# Altium footprint library Angler.PcbLib: 331 footprints (part 9 of 21)
Each footprint in its own frame and in the unit in brackets; x right, y up, seen from the top. Pads: shape width x height; smd on the part's side, far side on the other; paste and mask are expansions set on the pad; w line width, h text height; cw(c..) or ccw(c..) is an arc to the next point about the centre after c.
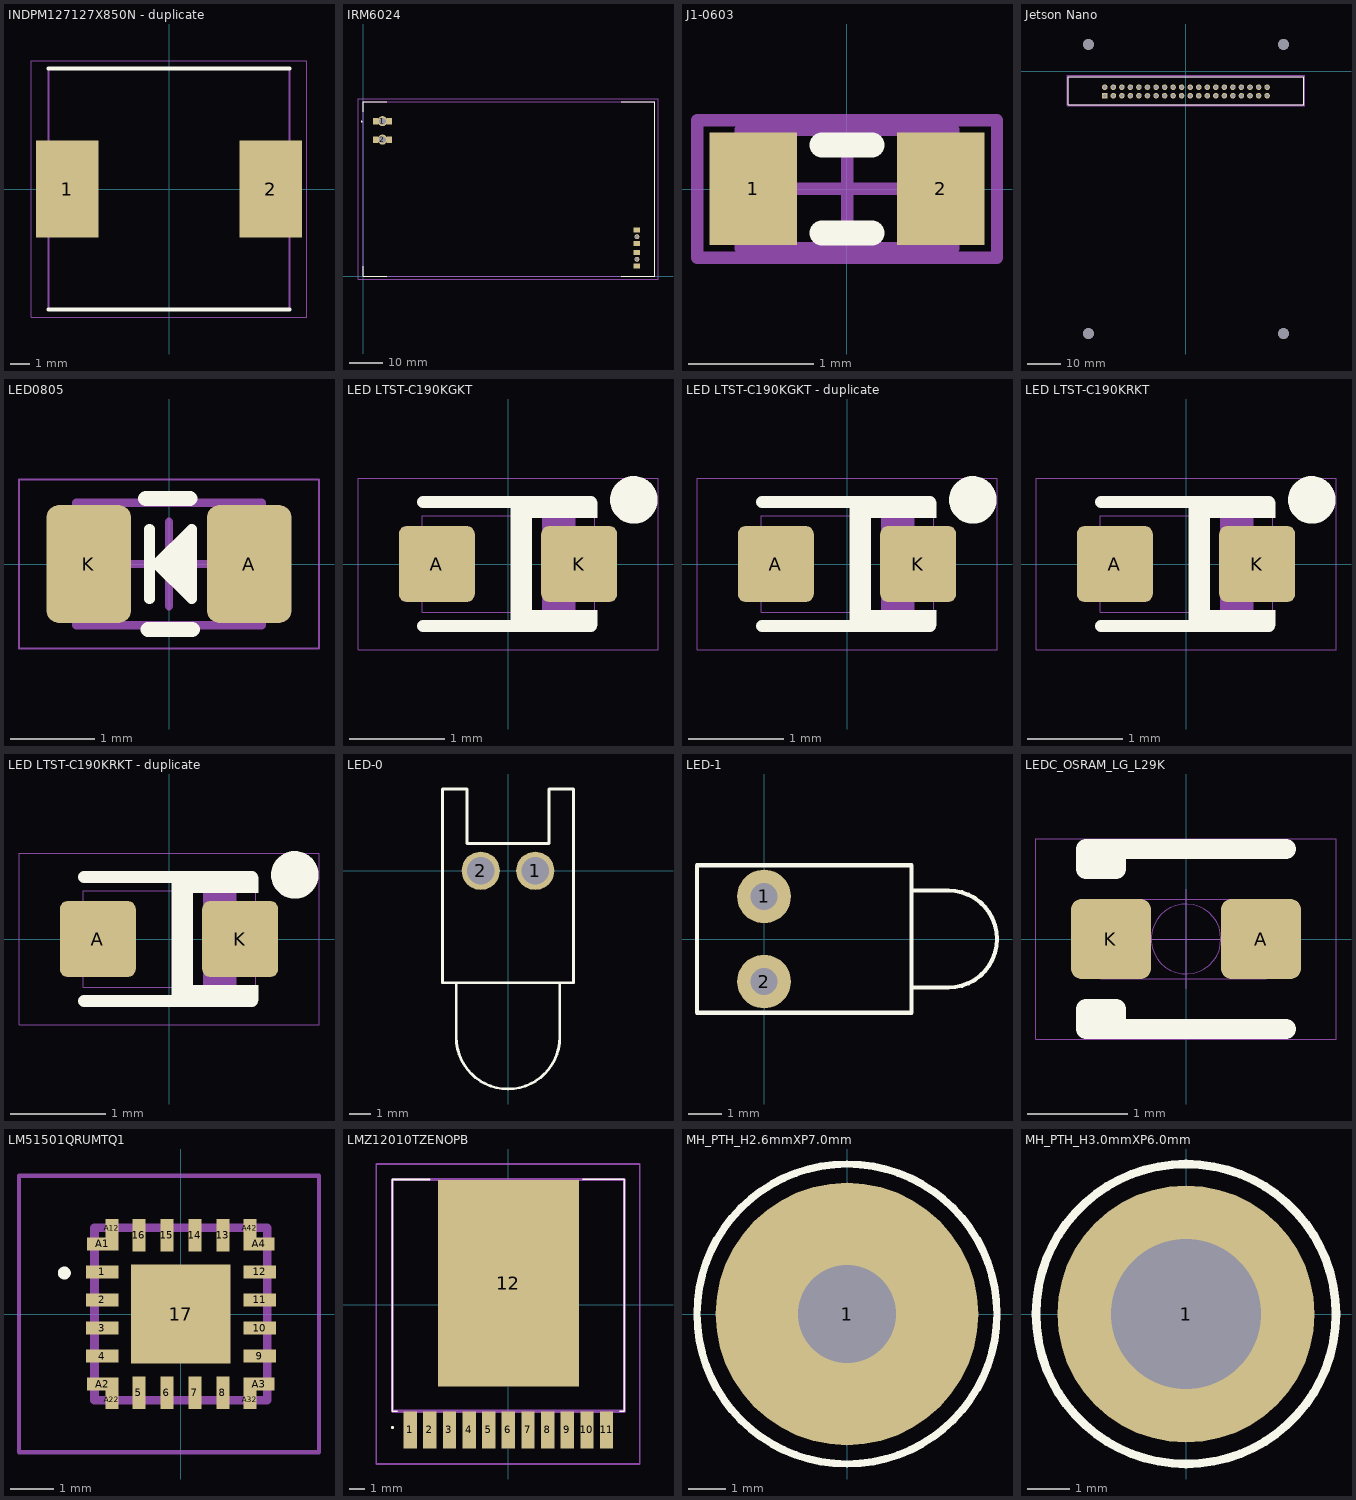
[diagram p8: the footprints below, top view; thin cyan lines are the x and y axes]

## INDPM127127X850N - duplicate [mm]
pads (2):
  rect 3.3x5.1 smd: 1(-5.35,0) 2(5.35,0)
Top Overlay:
  lines w0.2: -6.35,-6.35 6.35,-6.35 ; -6.35,6.35 6.35,6.35
Mechanical 13:
  lines w0.1: -6.35,-6.35 6.35,-6.35 6.35,6.35 -6.35,6.35 -6.35,-6.35
Mechanical 15:
  lines w0.05: -7.25,-6.75 7.25,-6.75 7.25,6.75 -7.25,6.75 -7.25,-6.75
3D body "SRR1208-6R5ML.stp": height 8.5, standoff 0, extent -6.35,-6.35 6.35,6.35

## IRM6024 [mm]
pads (12):
  rect 1.5x1.95 smd: 1(3.648,46.25) 1(7.752,46.25) 2(3.648,40.75) 2(7.752,40.75)
  round 3 hole 2: 1(5.7,46.25) 2(5.7,40.75)
  rect 1.95x1.5 smd: 3(81.7,2.948) 3(81.7,7.052) 4(81.7,9.698) 4(81.7,13.802)
  round 1.5 hole 1: 3(81.7,5) 4(81.7,11.75)
Top Overlay:
  lines w0.1: 0,3 0,0 7,0 ; 0,49 0,52 7,52 ; 77,0 87,0 87,52 77,52
  lines w0.2: -0.5,46 ccw(c-0.5,46.1) -0.5,46.2 ccw(c-0.5,46.1) -0.5,46
Mechanical 13:
  lines w0.2: 0,0 87,0 87,52 0,52 0,0
Mechanical 15:
  lines w0.1: -1.6,-1 88,-1 88,53 -1.6,53 -1.6,-1
3D body "s9131-45r.stp": height 4, standoff -0.06, extent 80.551,2.25 82.85,7.75
3D body "s9131-45r.stp": height 4, standoff -0.06, extent 80.551,9 82.85,14.5
3D body "IRM-60-48.stp": height 33, standoff -1, extent 0,0 87,52
3D body "s9111-45r.stp": height 4, standoff -0.06, extent 2.95,45.101 8.45,47.4
3D body "s9111-45r.stp": height 4, standoff -0.06, extent 2.95,39.601 8.45,41.9

## J1-0603 [mm] "Chip Resistor, Body 1.6x0.8mm, IPC High Density"
height 0.9
pads (2):
  rect 0.7x0.9 smd: 1(-0.75,0) 2(0.75,0)
Top Overlay:
  lines w0.2: -0.2,-0.35 0.2,-0.35 ; -0.2,0.35 0.2,0.35
Mechanical 13:
  lines w0.1: -0.85,-0.475 0.85,-0.475 0.85,0.475 -0.85,0.475 -0.85,-0.475
Mechanical 15:
  lines w0.1: -0.475,0 0.475,0 ; 0,-0.475 0,0.475 ; -1.2,-0.55 1.2,-0.55 1.2,0.55 -1.2,0.55 -1.2,-0.55
3D body: height 0.9, standoff 0, extent -0.85,-0.475 0.85,0.475

## Jetson Nano [mm]
pads (44):
  rect 1.65x1.65 hole 1.1: 1(-24.13,-7.27)
  round 1.65 hole 1.1: 2(-24.13,-4.73) 3(-21.59,-7.27) 4(-21.59,-4.73) 5(-19.05,-7.27) 6(-19.05,-4.73) 7(-16.51,-7.27) 8(-16.51,-4.73) 9(-13.97,-7.27) 10(-13.97,-4.73) 11(-11.43,-7.27) 12(-11.43,-4.73) 13(-8.89,-7.27) 14(-8.89,-4.73) 15(-6.35,-7.27) 16(-6.35,-4.73) 17(-3.81,-7.27) 18(-3.81,-4.73) 19(-1.27,-7.27) 20(-1.27,-4.73) 21(1.27,-7.27) 22(1.27,-4.73) 23(3.81,-7.27) 24(3.81,-4.73) 25(6.35,-7.27) 26(6.35,-4.73) 27(8.89,-7.27) 28(8.89,-4.73) 29(11.43,-7.27) 30(11.43,-4.73) 31(13.97,-7.27) 32(13.97,-4.73) 33(16.51,-7.27) 34(16.51,-4.73) 35(19.05,-7.27) 36(19.05,-4.73) 37(21.59,-7.27) 38(21.59,-4.73) 39(24.13,-7.27) 40(24.13,-4.73)
  round 3.2 hole 3.2 unplated: MH1(-29,8) MH2(29,8) MH3(-29,-78) MH4(29,-78)
Top Overlay:
  lines w0.2: -34.93,-9.93 34.97,-9.93 34.97,-1.63 -34.93,-1.63 -34.93,-9.93
Mechanical 13:
  lines w0.1: -34.93,-9.93 34.97,-9.93 34.97,-1.63 -34.93,-1.63 -34.93,-9.93
Mechanical 15:
  lines w0.05: -35.33,-10.23 35.37,-10.23 35.37,-1.23 -35.33,-1.23 -35.33,-10.23
3D body "93655A357_MALE-FEM THRDED HEX STANDOFF.STEP": height 19.95, standoff -3.95, extent 26.402,-80.12 31.598,-75.62
3D body "93655A357_MALE-FEM THRDED HEX STANDOFF.STEP": height 19.95, standoff -3.95, extent -31.598,-80.12 -26.402,-75.62
3D body "93655A357_MALE-FEM THRDED HEX STANDOFF.STEP": height 19.95, standoff -3.95, extent 26.402,5.75 31.598,10.25
3D body "93655A357_MALE-FEM THRDED HEX STANDOFF.STEP": height 19.95, standoff -3.95, extent -31.598,5.75 -26.402,10.25
3D body "61304021121_Download_STP_61304021121_rev1.stp": height 8.77, standoff -2.77, extent -25.4,-8.54 25.4,-3.46
3D body "P3450_P3449_A02_P3448_A02.stp": height 48.28, standoff 17.78, extent -48.511,-88 32.511,12

## LED0805 [mm] "0805, Body 2.00x1.25x1.0mm, IPC Medium Density"
height 1
pads (2):
  rrect30% 1x1.4 smd mask+0.064: A(0.95,0) K(-0.95,0)
Top Overlay:
  circle w0.254: c0.098,0.01 r0.072
  lines w0.127: -0.23,-0.41 -0.23,0.41 ; 0.198,0.25 0.198,-0.34 0.268,-0.41 ; 0.268,-0.41 0.268,0.41 -0.142,0 0.268,-0.41
  lines w0.178: -0.275,0.775 0.25,0.775 ; -0.25,-0.775 0.275,-0.775
Mechanical 9:
  lines w0.1: -1.1,-0.725 1.1,-0.725 1.1,0.725 -1.1,0.725 -1.1,-0.725
Mechanical 11:
  text "'.Designator'" at -0.5,-0.3 h0.5
Mechanical 15:
  lines w0.025: -1.775,-1 1.775,-1 1.775,1 -1.775,1 -1.775,-1
  lines w0.1: -0.5,0 0.5,0 ; 0,-0.5 0,0.5
3D body "150080AS75000_Download_STP_WL-SMCW-0805_rev1.stp": height 0.7, standoff 0, extent -1,-0.625 1,0.625

## LED LTST-C190KGKT [mm]
pads (2):
  rrect20% 0.8x0.8 smd mask+0.064: A(-0.75,0) K(0.75,0)
Top Overlay:
  circle w0.25: c1.325,0.675 r0.125
  rectangle: 0.025,-0.686 0.254,0.686
  rectangle: 0.025,-0.651 0.94,-0.483
  rectangle: 0.09,0.483 0.94,0.66
  lines w0.127: -0.895,-0.651 0.875,-0.651 ; -0.895,0.651 0.875,0.651
Mechanical 9:
  rectangle: 0.357,-0.508 0.711,0.508
  lines w0.013: -0.901,-0.508 0.913,-0.508 0.913,0.508 -0.901,0.508 -0.901,-0.508
Mechanical 11:
  text ".Designator" at -1.803,-0.533 h0.51
Mechanical 15:
  lines w0.013: -1.579,-0.902 -1.579,0.902 1.579,0.902 1.579,-0.902 -1.579,-0.902
3D body: height 0.8, standoff 0, extent -0.907,-0.508 0.907,0.508
3D body: height 0.81, standoff 0, extent -0.347,-0.349 0.35,0.35

## LED LTST-C190KGKT - duplicate [mm]
pads (2):
  rrect20% 0.8x0.8 smd mask+0.064: A(-0.75,0) K(0.75,0)
Top Overlay:
  circle w0.25: c1.325,0.675 r0.125
  rectangle: 0.025,-0.686 0.254,0.686
  rectangle: 0.025,-0.651 0.94,-0.483
  rectangle: 0.09,0.483 0.94,0.66
  lines w0.127: -0.895,-0.651 0.875,-0.651 ; -0.895,0.651 0.875,0.651
Mechanical 9:
  rectangle: 0.357,-0.508 0.711,0.508
  lines w0.013: -0.901,-0.508 0.913,-0.508 0.913,0.508 -0.901,0.508 -0.901,-0.508
Mechanical 11:
  text ".Designator" at -1.803,-0.533 h0.51
Mechanical 15:
  lines w0.013: -1.579,-0.902 -1.579,0.902 1.579,0.902 1.579,-0.902 -1.579,-0.902
3D body: height 0.8, standoff 0, extent -0.907,-0.508 0.907,0.508
3D body: height 0.81, standoff 0, extent -0.347,-0.349 0.35,0.35

## LED LTST-C190KRKT [mm]
pads (2):
  rrect20% 0.8x0.8 smd mask+0.064: A(-0.75,0) K(0.75,0)
Top Overlay:
  circle w0.25: c1.325,0.675 r0.125
  rectangle: 0.025,-0.686 0.254,0.686
  rectangle: 0.09,0.483 0.94,0.66
  rectangle: 0.025,-0.651 0.94,-0.483
  lines w0.127: -0.895,-0.651 0.875,-0.651 ; -0.895,0.651 0.875,0.651
Mechanical 9:
  rectangle: 0.357,-0.508 0.711,0.508
  lines w0.013: -0.901,-0.508 -0.901,0.508 0.913,0.508 0.913,-0.508 -0.901,-0.508
Mechanical 11:
  text ".Designator" at -0.94,-0.203 h0.51
Mechanical 15:
  lines w0.013: -1.579,-0.902 1.579,-0.902 1.579,0.902 -1.579,0.902 -1.579,-0.902
3D body: height 0.81, standoff 0, extent -0.35,-0.35 0.35,0.35
3D body: height 0.8, standoff 0, extent -0.907,-0.508 0.907,0.508

## LED LTST-C190KRKT - duplicate [mm]
pads (2):
  rrect20% 0.8x0.8 smd mask+0.064: A(-0.75,0) K(0.75,0)
Top Overlay:
  circle w0.25: c1.325,0.675 r0.125
  rectangle: 0.025,-0.686 0.254,0.686
  rectangle: 0.09,0.483 0.94,0.66
  rectangle: 0.025,-0.651 0.94,-0.483
  lines w0.127: -0.895,-0.651 0.875,-0.651 ; -0.895,0.651 0.875,0.651
Mechanical 9:
  rectangle: 0.357,-0.508 0.711,0.508
  lines w0.013: -0.901,-0.508 -0.901,0.508 0.913,0.508 0.913,-0.508 -0.901,-0.508
Mechanical 11:
  text ".Designator" at -0.94,-0.203 h0.51
Mechanical 15:
  lines w0.013: -1.579,-0.902 1.579,-0.902 1.579,0.902 -1.579,0.902 -1.579,-0.902
3D body: height 0.81, standoff 0, extent -0.35,-0.35 0.35,0.35
3D body: height 0.8, standoff 0, extent -0.907,-0.508 0.907,0.508

## LED-0 [mil] "LED; 2 Leads"
pads (2):
  round 70 hole 50: 1(50,0) 2(-50,0)
Top Overlay:
  lines w5: -95,-205 -95,-305 ccw(c0,-305) 95,-305 95,-205 ; -120,-205 120,-205 120,150 75,150 75,50 -75,50 -75,150 -120,150 -120,-205

## LED-1 [mm] "LED; 2 Leads"
pads (2):
  round 1.6 hole 0.8: 1(0,1.27) 2(0,-1.27)
Top Overlay:
  lines w0.127: 4.4,-1.45 5.5,-1.45 ccw(c5.5,0) 5.5,1.45 4.4,1.45 ; -2,-2.2 -2,2.2 4.4,2.2 4.4,-2.2 -2,-2.2

## LEDC_OSRAM_LG_L29K [mm] "LED,Chip;1.70mm L X 0.80mm W X 0.67mm H"
height 0.67
pads (2):
  rrect25% 0.8x0.8 smd paste-10 mask+0.064: A(0.75,0) K(-0.75,0)
Top Overlay:
  lines w0.2: -0.7,-0.9 -0.7,-0.7 -1,-0.7 -1,-0.9 1,-0.9 ; -0.7,0.9 -0.7,0.7 -1,0.7 -1,0.9 1,0.9
Top Paste:
  region: -1.05,0.35 -0.5,0.35 -0.5,-0.35 -1.05,-0.35 -1.06,-0.35 -1.078,-0.342 -1.092,-0.328 -1.1,-0.31 -1.1,-0.3 -1.1,0.3 -1.1,0.31 -1.092,0.328 -1.078,0.342 -1.06,0.35
  region: 1.05,-0.35 0.5,-0.35 0.5,0.35 1.05,0.35 1.06,0.35 1.078,0.342 1.092,0.328 1.1,0.31 1.1,0.3 1.1,-0.3 1.1,-0.31 1.092,-0.328 1.078,-0.342 1.06,-0.35
Mechanical 9:
  region: -0.85,0.4 -0.5,0.4 -0.5,-0.4 -0.85,-0.4
  lines w0.01: -0.85,-0.4 -0.85,0.4 0.8,0.4 0.8,-0.4 -0.85,-0.4
Mechanical 11:
  text ".Designator" at -0.8,-0.2 h1
Mechanical 15:
  circle w0.01: c0,0 r0.35
  lines w0.01: -0.5,0 0.5,0 ; 0,-0.5 0,0.5 ; -1.5,-1 1.5,-1 1.5,1 -1.5,1 -1.5,-1
3D body: height 0.13, standoff 0, extent -0.85,-0.4 0.85,0.4
3D body: height 0.65, standoff 0.13, extent -0.65,-0.4 0.65,0.4

## LM51501QRUMTQ1 [mm]
pads (25):
  rect 0.75x0.3 smd: 1(-1.825,0.975) 2(-1.825,0.325) 3(-1.825,-0.325) 4(-1.825,-0.975) 9(1.825,-0.975) 10(1.825,-0.325) 11(1.825,0.325) 12(1.825,0.975)
  rect 0.3x0.75 smd: 5(-0.975,-1.825) 6(-0.325,-1.825) 7(0.325,-1.825) 8(0.975,-1.825) 13(0.975,1.825) 14(0.325,1.825) 15(-0.325,1.825) 16(-0.975,1.825)
  rect 2.3x2.3 smd: 17(0,0)
  rect 0.725x0.3 smd: A1(-1.812,1.625) A2(-1.812,-1.625) A3(1.812,-1.625) A4(1.812,1.625)
  rect 0.3x0.425 smd: A12(-1.6,1.987) A22(-1.6,-1.987) A32(1.6,-1.987) A42(1.6,1.987)
Top Overlay:
  lines w0.2: -2.7,0.9 cw(c-2.7,0.95) -2.7,1 ; -2.7,0.9 ccw(c-2.7,0.95) -2.7,1 ; -2.7,0.9 cw(c-2.7,0.95) -2.7,1
Mechanical 13:
  lines w0.2: -2,-2 2,-2 2,2 -2,2 -2,-2
Mechanical 15:
  lines w0.1: -3.75,-3.2 3.2,-3.2 3.2,3.2 -3.75,3.2 -3.75,-3.2
3D body "LM51501QRUMTQ1.stp": height 0.9, standoff 0, extent -2,-2 2,2

## LMZ12010TZENOPB [mm]
pads (12):
  rect 0.86x2.41 smd: 1(-6.35,-8.102) 2(-5.08,-8.102) 3(-3.81,-8.102) 4(-2.54,-8.102) 5(-1.27,-8.102) 6(0,-8.102) 7(1.27,-8.102) 8(2.54,-8.102) 9(3.81,-8.102) 10(5.08,-8.102) 11(6.35,-8.102)
  rect 9.126x13.37 smd: 12(0,1.398)
Top Overlay:
  lines w0.1: -7.2,-6.897 -7.5,-6.897 -7.5,8.098 -5.1,8.098 ; 4.8,8.102 7.5,8.102 7.5,-6.897 7.2,-6.897 ; -7.5,-8 ccw(c-7.5,-7.95) -7.5,-7.9 ccw(c-7.5,-7.95) -7.5,-8
Mechanical 13:
  lines w0.2: -7.5,-6.897 7.5,-6.897 7.5,8.102 -7.5,8.102 -7.5,-6.897
Mechanical 15:
  lines w0.1: -8.55,-10.307 8.5,-10.307 8.5,9.102 -8.55,9.102 -8.55,-10.307
3D body "LMZ12010TZE_NOPB.stp": height 10, standoff 0, extent -7.5,-6.897 7.5,8.102

## MH_PTH_H2.6mmXP7.0mm [mm] "Plated Through Hole, 2.6mm hole x 7.0mm pad"
pads (1):
  round 7 hole 2.6 mask+0.064: 1(0,0)
Top Overlay:
  circle w0.2: c0,0 r4
Bottom Overlay:
  circle w0.254: c0,0 r4
Mechanical 11:
  text ".Designator" at -2.6,-1.3 h3
Mechanical 15:
  circle w0.01: c0,0 r4

## MH_PTH_H3.0mmXP6.0mm [mm] "Plated Through Hole, 3.0mm hole x 6.0mm pad"
pads (1):
  round 6 hole 3.5 mask+0.064: 1(0,0)
Top Overlay:
  circle w0.2: c0,0 r3.5
Bottom Overlay:
  circle w0.254: c0,0 r3.5
Mechanical 11:
  text ".Designator" at -1.3,-0.9 h3
Mechanical 15:
  circle w0.01: c0,0 r3.5